# Altium footprint library UNO_PCB_lib.PcbLib: 27 footprints (part 1 of 2)
Each footprint in its own frame and in the unit in brackets; x right, y up, seen from the top. Pads: shape width x height; smd on the part's side, far side on the other; paste and mask are expansions set on the pad; w line width, h text height; cw(c..) or ccw(c..) is an arc to the next point about the centre after c.
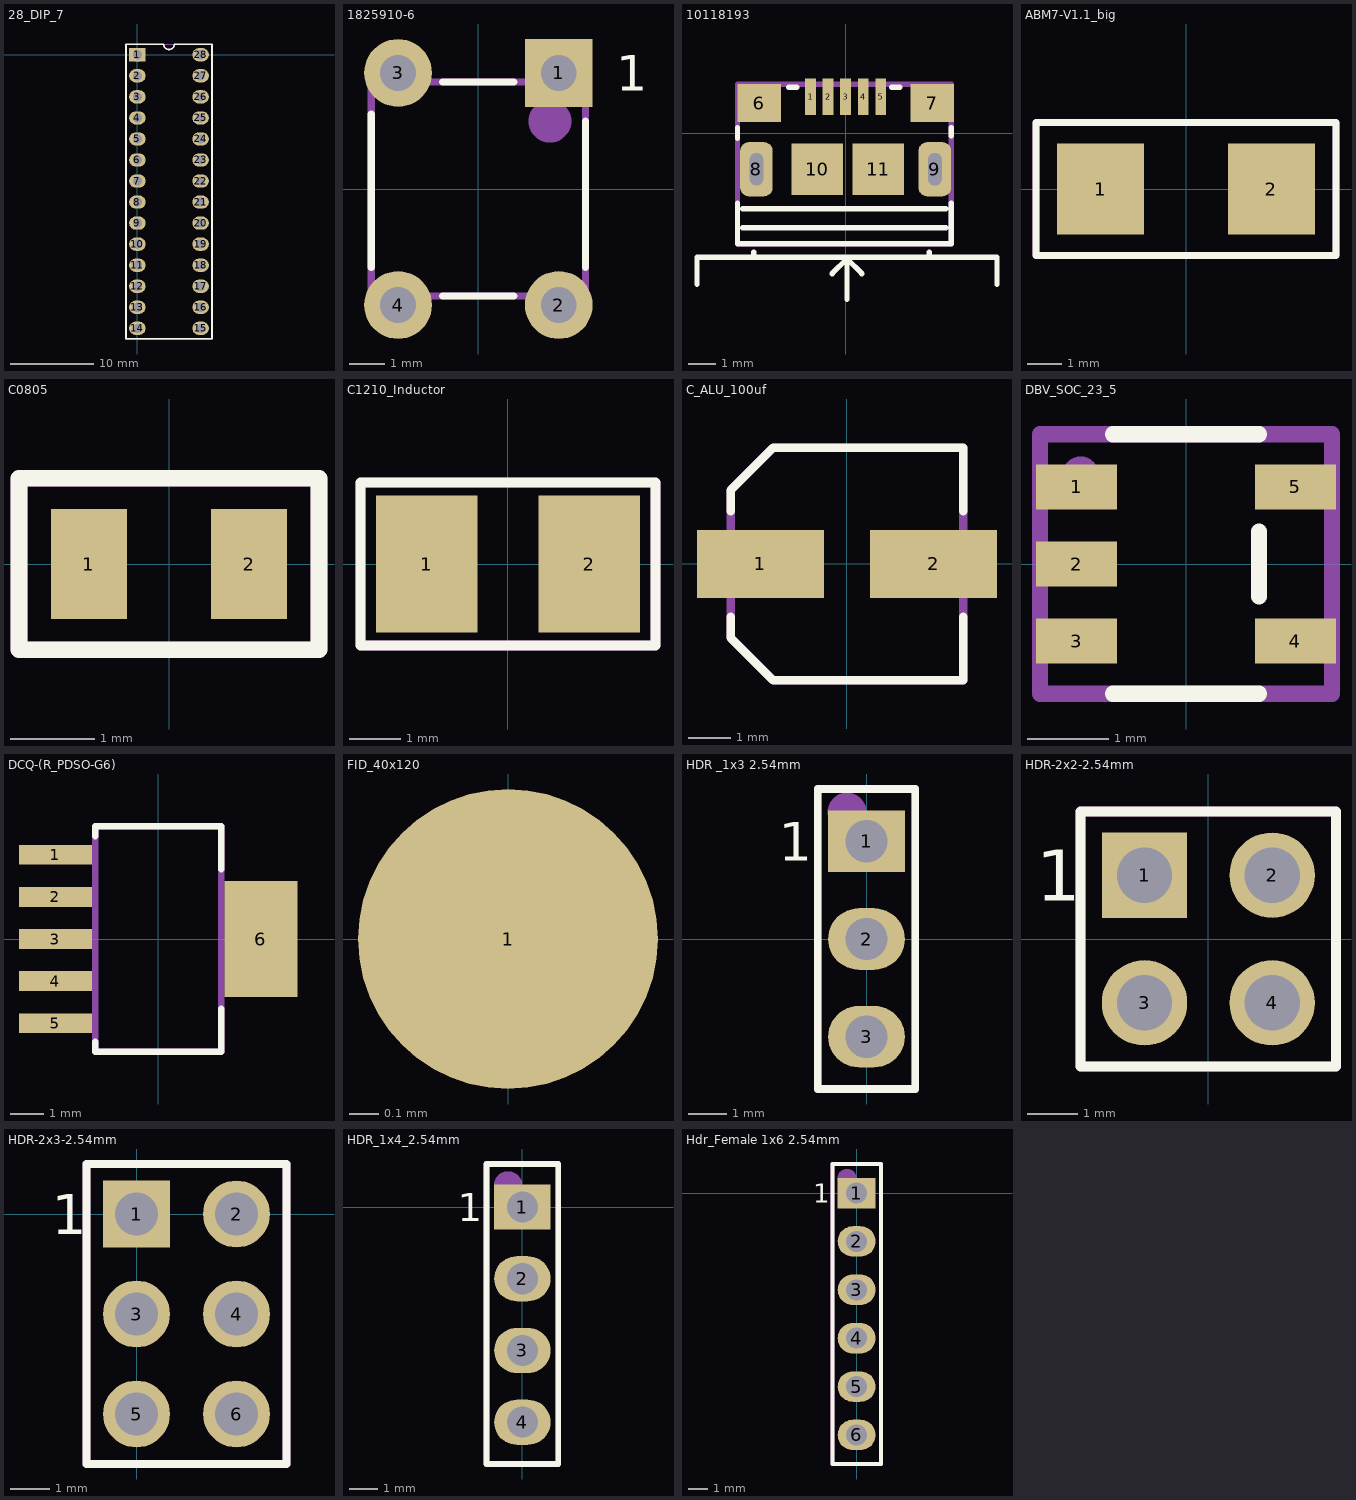
[diagram p0: the footprints below, top view; thin cyan lines are the x and y axes]

## 28_DIP_7 [mm]
pads (28):
  rect 2x1.6 hole 1.1: 1(0,0)
  oval 2x1.6 hole 1.1: 2(0,-2.54) 3(0,-5.08) 4(0,-7.62) 5(0,-10.16) 6(0,-12.7) 7(0,-15.24) 8(0,-17.78) 9(0,-20.32) 10(0,-22.86) 11(0,-25.4) 12(0,-27.94) 13(0,-30.48) 14(0,-33.02) 15(7.62,-33.02) 16(7.62,-30.48) 17(7.62,-27.94) 18(7.62,-25.4) 19(7.62,-22.86) 20(7.62,-20.32) 21(7.62,-17.78) 22(7.62,-15.24) 23(7.62,-12.7) 24(7.62,-10.16) 25(7.62,-7.62) 26(7.62,-5.08) 27(7.62,-2.54) 28(7.62,0)
Top Overlay:
  lines w0.2: -1.39,-34.29 -1.39,1.27 3.175,1.27 ccw(c3.81,1.27) 4.445,1.27 9.01,1.27 9.01,-34.29 -1.39,-34.29
Top Assembly:
  circle w0.8: c0.01,-0.01 r0.447
  lines w0.125: -1.39,-34.31 9.01,-34.31 9.01,1.29 -1.39,1.29 -1.39,-34.31
  text "'.Designator'" at 5.31,-24.31 h3
3D body "User Library-28 pin dip-1.step": height 7.55, standoff 1.33, extent 0.01,-34.481 7.884,1.461

## 28_DIP_7.64MM_SOCKET [mm]
3D body "dil_socket.stp": height 4.2, standoff -3.17, extent -5.05,-17.75 5.05,17.75

## 1825910-6 [mm]
pads (4):
  rect 1.9x1.9 hole 1: 1(2.25,3.25)
  round 1.9 hole 1: 2(2.25,-3.25) 3(-2.25,3.25) 4(-2.25,-3.25)
Top Overlay:
  lines w0.2: -3,-2.2 -3,2.1 ; -1,-3 1,-3 ; -1,3 1,3 ; 3,-2.2 3,1.9
  text "1" at 3.854,2.754 h1
Top Assembly:
  circle w1: c2,1.9 r0.1
  lines w0.2: -3,-3 3,-3 3,3 -3,3 -3,2.1 -3,-3
3D body "User Library-FSM4JLH(1825910-5).step": height 5, standoff -3.51, extent -2.995,-3.898 2.995,3.9

## 10118193 [mm]
pads (11):
  rect 0.4x1.35 smd mask+0.05: 1(-1.3,1.338) 2(-0.65,1.338) 3(0,1.338) 4(0.65,1.338) 5(1.3,1.338)
  rect 1.6x1.4 smd: 6(-3.2,1.112) 7(3.2,1.112)
  rrect50% 1.2x2 hole 0.5 slot 1.2 at 90 deg: 8(-3.3,-1.338) 9(3.3,-1.338)
  rect 1.9x1.9 smd: 10(-1.05,-1.338) 11(1.2,-1.338)
Top Overlay:
  lines w0.2: -5.5,-5.6 -5.5,-4.6 5.6,-4.6 5.6,-5.6 ; -4,-2.6 -4,-4.1 3.9,-4.1 3.9,-2.6 ; -4,-0.2 -4,0.2 ; -3.8,-3.5 -3.4,-3.5 ; -3.8,-2.8 -3.3,-2.8 3.7,-2.8 ; -3.4,-4.6 -3.4,-4.4 ; -2.1,1.7 -1.8,1.7 ; -0.5,-5.2 0.05,-4.65 ; 0.05,-6.15 0.05,-4.6 0.05,-4.65 ; 0.6,-5.2 0.05,-4.65 ; 1.7,1.7 2,1.7 ; 3.1,-4.6 3.1,-4.4 ; 3.9,-0.1 3.9,0.2 ; -3.4,-3.5 3.7,-3.5 -3.4,-3.5
Top Assembly:
  lines w0.2: -4,-4.1 3.9,-4.1 3.9,1.8 -4,1.8 -4,-4.1
  text "'.Designator'" at -2.846,-1.113 h1
3D body "10118193-0001lfc.stp": height 2.87, standoff -0.73, extent -3.953,-4.038 3.904,1.623

## ABM7-V1.1_big [mm]
pads (2):
  rect 2.5x2.6 smd: 1(-2.45,0) 2(2.45,0)
Top Overlay:
  lines w0.2: -4.3,-1.9 4.3,-1.9 4.3,1.9 -4.3,1.9 -4.3,-1.9
Top Assembly:
  lines w0.2: -4.3,-1.9 4.3,-1.9 4.3,1.9 -4.3,1.9 -4.3,-1.9
  text "'.Designator'" at -3.346,-0.638 h1.52
3D body "ABM7.STEP": height 1.41, standoff 0.01, extent -2.997,-1.753 2.997,1.753

## C0805 [mm]
pads (2):
  rect 0.9x1.3 smd: 1(-0.95,0) 2(0.95,0)
Top Overlay:
  lines w0.2: -1.778,-1.016 1.778,-1.016 1.778,1.016 -1.778,1.016 -1.778,-1.016
Top Assembly:
  lines w0.2: -1.778,-1.016 1.778,-1.016 1.778,1.016 -1.778,1.016 -1.778,-1.016
  text "'.Designator'" at -1.016,-0.423 h1.02
3D body: height 0.25, standoff 0, extent -1,-0.645 1,0.645

## C1210_Inductor [mm]
pads (2):
  rect 2x2.7 smd: 1(-1.6,0) 2(1.6,0)
Top Overlay:
  lines w0.2: -2.9,-1.6 2.9,-1.6 2.9,1.6 -2.9,1.6 -2.9,-1.6
Top Assembly:
  lines w0.2: -2.9,-1.6 2.9,-1.6 2.9,1.6 -2.9,1.6 -2.9,-1.6
  text "'.Designator'" at -1.246,-0.413 h1
3D body: height 2.7, standoff -0.01, extent -1.5,-1.25 -1.2,1.25
3D body: height 2.7, standoff -0.01, extent 1.2,-1.25 1.5,1.25
3D body: height 2.7, standoff -0.01, extent -1.2,-1.25 1.2,1.25

## C_ALU_100uf [mm]
pads (2):
  rect 3x1.6 smd: 1(-2.05,0) 2(2.05,0)
Top Overlay:
  lines w0.2: -2.75,-1.25 -2.75,-1.75 -1.75,-2.75 -1.5,-2.75 2.75,-2.75 2.75,-1.25 ; -2.75,1.25 -2.75,1.75 -1.75,2.75 -1.5,2.75 2.75,2.75 2.75,1.25
Top Assembly:
  lines w0.2: -2.75,-1.75 -2.75,1.75 -1.75,2.75 2.75,2.75 2.75,-2.75 -1.75,-2.75 -2.75,-1.75
  text "'.Designator'" at -2.246,-0.738 h1.52
3D body "User Library-capacitor size C.step": height 5.42, standoff 0.01, extent -2.95,-2.65 2.95,2.65

## DBV_SOC_23_5 [mm]
pads (5):
  rect 1x0.55 smd: 1(-1.35,0.95) 2(-1.35,0) 3(-1.35,-0.95) 4(1.35,-0.95) 5(1.35,0.95)
Top Overlay:
  lines w0.2: -0.9,-1.6 0.9,-1.6 ; -0.9,1.6 0.9,1.6 ; 0.9,-0.4 0.9,0.4
Top Assembly:
  circle w0.254: c-1.3,1.1 r0.1
  lines w0.2: -1.8,-1.6 -1.8,1.6 1.8,1.6 1.8,-1.6 -1.8,-1.6
  text "'.Designator'" at -1.346,-0.613 h1
3D body "User Library-TPS560200DBV.SLDPRT": height 1.45, standoff 0, extent -1.514,-1.5 1.514,1.5

## DCQ-(R_PDSO-G6) [mm]
pads (6):
  rect 2.2x0.6 smd: 1(-3.1,2.54) 2(-3.1,1.27) 3(-3.1,0) 4(-3.1,-1.27) 5(-3.1,-2.54)
  rect 2.2x3.5 smd: 6(3.1,0)
Top Overlay:
  lines w0.2: -1.9,-3.1 -1.9,-3.4 1.9,-3.4 1.9,-2.1 ; -1.9,3.1 -1.9,3.4 1.9,3.4 1.9,2.1
Top Assembly:
  lines w0.2: -1.9,-3.4 1.9,-3.4 1.9,3.4 -1.9,3.4 -1.9,-3.4
  text "'.Designator'" at -1.446,-0.313 h1
3D body "User Library-TPS73701DCQ.step": height 1.8, standoff 0, extent -3.63,-3.275 3.63,3.275

## FID_40x120 [mil]
pads (1):
  round 40 smd paste-40 mask+40: 1(0,0)

## HDR _1x3 2.54mm [mm]
pads (3):
  rect 2x1.6 hole 1.1: 1(0,2.54)
  oval 2x1.6 hole 1.1: 2(0,0) 3(0,-2.54)
Top Overlay:
  lines w0.2: -1.27,-3.9 -1.27,3.9 1.27,3.9 1.27,-3.9 -1.27,-3.9
  text "1" at -2.286,2.032 h1
Top Assembly:
  circle w0.5: c-0.508,3.302 r0.254
  lines w0.2: -1.27,-3.9 -1.27,3.9 1.27,3.9 1.27,-3.9 -1.27,-3.9
  text "'.Designator'" at 0.313,-0.706 h1
3D body "User Library-HDR1x3.SLDPRT": height 8.39, standoff -3.8, extent -1.24,-3.81 1.3,3.81

## HDR-2x2-2.54mm [mm]
pads (4):
  rect 1.7x1.7 hole 1.1: 1(-1.27,1.27)
  round 1.7 hole 1.1: 2(1.27,1.27) 3(-1.27,-1.27) 4(1.27,-1.27)
Top Overlay:
  lines w0.2: -0.635,2.54 2.54,2.54 2.54,-2.54 -2.54,-2.54 -2.54,2.54 0.635,2.54
  text "1" at -3.429,0.762 h1.02
Top Assembly:
  circle w0.508: c-1.397,1.524 r0.254
  lines w0.2: -2.54,-2.54 2.54,-2.54 2.54,2.54 -2.54,2.54 -2.54,-2.54
  text "'.Designator'" at -1.143,-1.016 h1.52
3D body "961204-6404-XX.stp": height 7.5, standoff -3.8, extent -2.54,-2.54 2.54,2.46

## HDR-2x3-2.54mm [mm]
pads (6):
  rect 1.7x1.7 hole 1.1: 1(0,0)
  round 1.7 hole 1.1: 2(2.54,0) 3(0,-2.54) 4(2.54,-2.54) 5(0,-5.08) 6(2.54,-5.08)
Top Overlay:
  lines w0.2: 0.635,1.27 3.81,1.27 3.81,-6.35 -1.27,-6.35 -1.27,1.27 1.905,1.27
  text "1" at -2.159,-0.508 h1.02
Top Assembly:
  circle w0.508: c-0.127,0.254 r0.254
  lines w0.2: -1.27,-6.35 -1.27,1.27 3.81,1.27 3.81,-6.35 -1.27,-6.35
  text "'.Designator'" at -0.381,-4.699 h1.52
3D body "User Library-2x3 Header.SLDPRT": height 8.51, standoff -2.99, extent -1.27,-6.35 3.77,1.27

## HDR_1x4_2.54mm [mm]
pads (4):
  rect 2x1.6 hole 1.1: 1(0,0)
  oval 2x1.6 hole 1.1: 2(0,-2.54) 3(0,-5.08) 4(0,-7.62)
Top Overlay:
  lines w0.2: -1.27,-9.1 -1.27,1.524 1.27,1.524 1.27,-9.1 -1.27,-9.1
  text "1" at -2.286,-0.508 h1
Top Assembly:
  circle w0.5: c-0.508,0.762 r0.254
  lines w0.2: -1.27,-9.1 -1.27,1.524 1.27,1.524 1.27,-9.1 -1.27,-9.1
  text "'.Designator'" at 0.538,-6.546 h1.52
3D body "User Library-HDR1x4.step": height 8.39, standoff -3.8, extent -1.24,-8.88 1.3,1.28

## Hdr_Female 1x6 2.54mm [mm]
pads (6):
  rect 2x1.6 hole 1.1: 1(0,0)
  oval 2x1.6 hole 1.1: 2(0,-2.54) 3(0,-5.08) 4(0,-7.62) 5(0,-10.16) 6(0,-12.7)
Top Overlay:
  lines w0.2: -1.27,-14.224 1.27,-14.224 1.27,1.524 -1.27,1.524 -1.27,-14.224
  text "1" at -2.286,-0.508 h1
Top Assembly:
  circle w0.5: c-0.508,0.762 r0.254
  lines w0.2: -1.27,-14.224 1.27,-14.224 1.27,1.524 -1.27,1.524 -1.27,-14.224
  text "'.Designator'" at 0.762,-9.652 h1.52
3D body "m20-7910642_asm.stp": height 8.51, standoff -3.39, extent -1.23,-14.095 1.27,1.395